# Altium footprint library Molex FFC - FPC Connectors (Through-Hole).PcbLib: 219 footprints (part 8 of 14)
Each footprint in its own frame and in the unit in brackets; x right, y up, seen from the top. Pads: shape width x height; smd on the part's side, far side on the other; paste and mask are expansions set on the pad; w line width, h text height; cw(c..) or ccw(c..) is an arc to the next point about the centre after c.
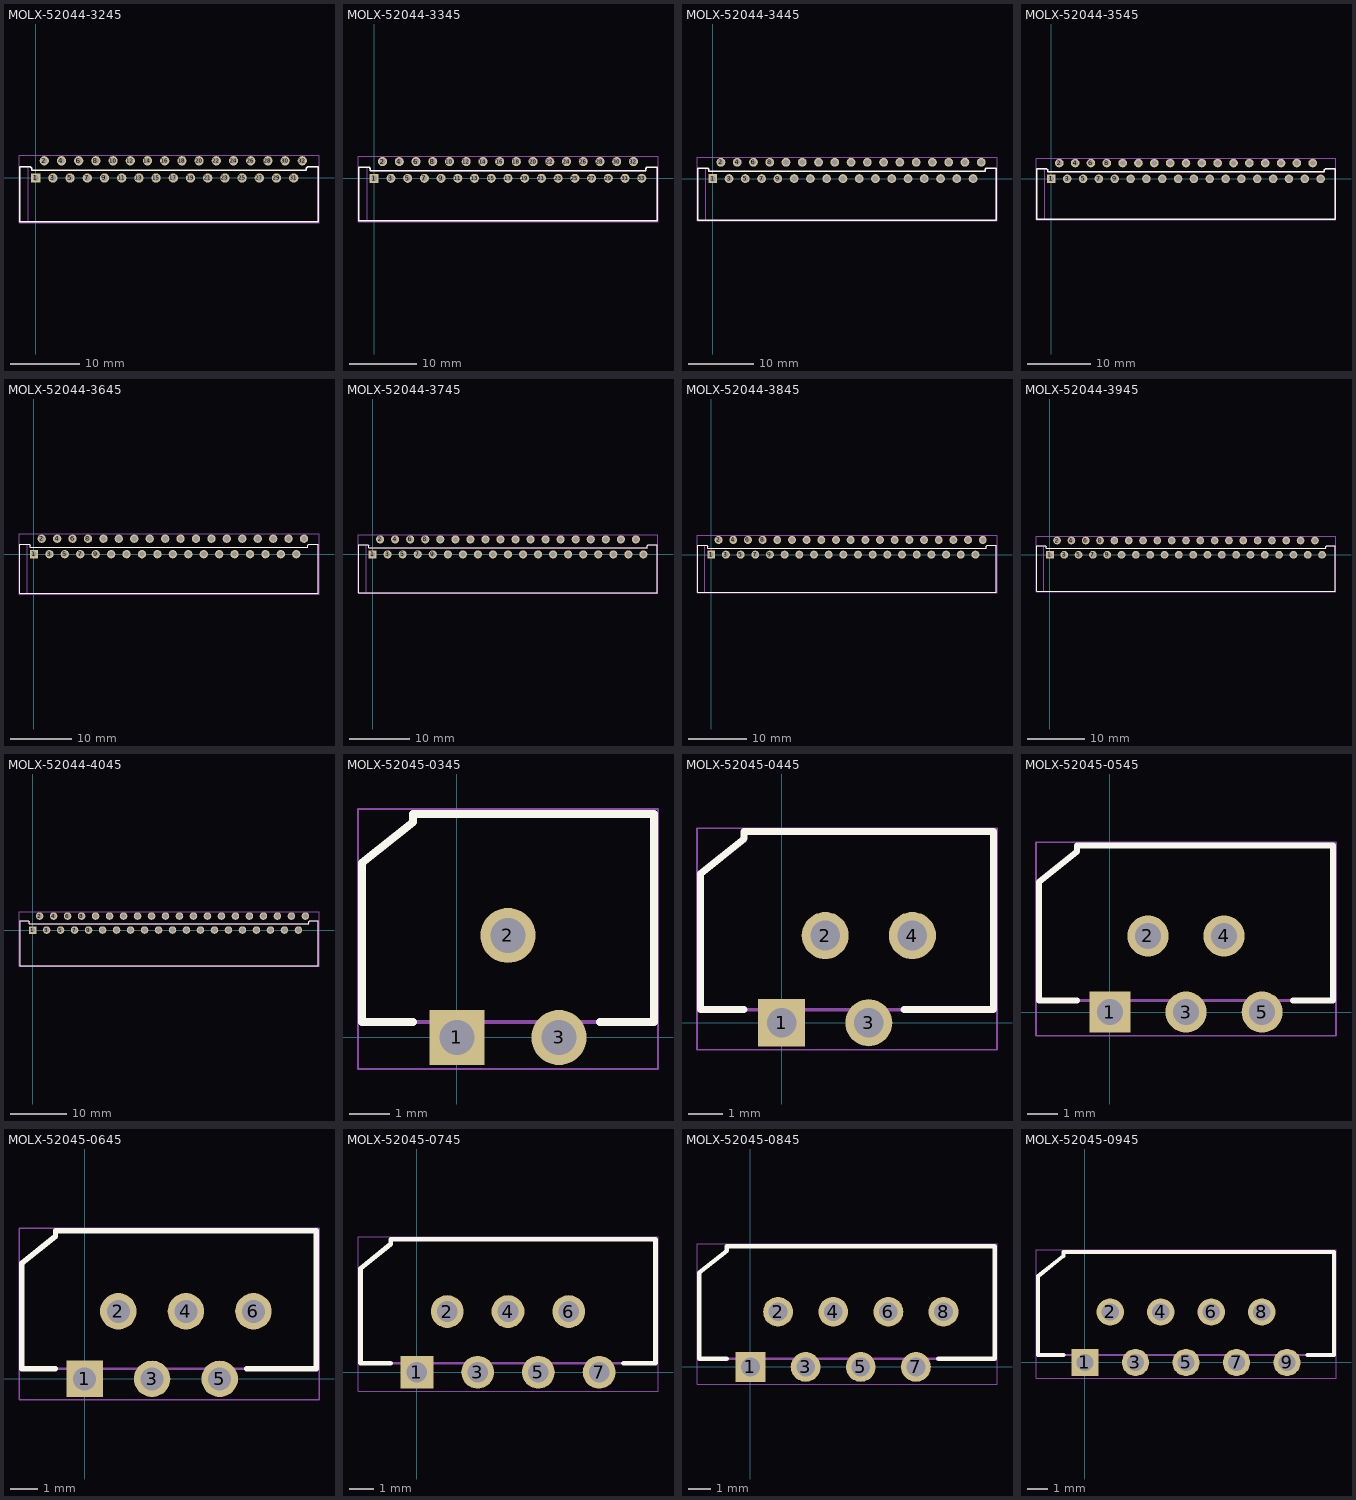
[diagram p7: the footprints below, top view; thin cyan lines are the x and y axes]

## MOLX-52044-3245 [mm] "FFC Connector, 32-Leads, Right Angle, Pitch 1.25 mm, Mated Height 5.1 mm, Through Hole"
height 5.012
pads (32):
  rect 1.35x1.35 hole 0.85: 1(0,0)
  round 1.35 hole 0.85: 2(1.25,2.5) 3(2.5,0) 4(3.75,2.5) 5(5,0) 6(6.25,2.5) 7(7.5,0) 8(8.75,2.5) 9(10,0) 10(11.25,2.5) 11(12.5,0) 12(13.75,2.5) 13(15,0) 14(16.25,2.5) 15(17.5,0) 16(18.75,2.5) 17(20,0) 18(21.25,2.5) 19(22.5,0) 20(23.75,2.5) 21(25,0) 22(26.25,2.5) 23(27.5,0) 24(28.75,2.5) 25(30,0) 26(31.25,2.5) 27(32.5,0) 28(33.75,2.5) 29(35,0) 30(36.25,2.5) 31(37.5,0) 32(38.75,2.5)
Top Overlay:
  lines w0.2: -0.775,1.625 -0.6,1.45 -0.6,1.125 39.35,1.125 39.35,1.45 39.525,1.625 41.075,1.625 41.075,-6.375 -2.325,-6.375 -2.325,1.625 -0.775,1.625 ; -0.775,1.625 -0.775,1.625
Mechanical 13:
  lines w0.1: -1.075,-6.375 -1.075,1.625 ; -2.325,-6.375 -2.325,1.625 -0.775,1.625 -0.6,1.45 -0.6,1.125 39.35,1.125 39.35,1.45 39.525,1.625 41.075,1.625 41.075,-6.375 -2.325,-6.375
Mechanical 15:
  lines w0.05: -2.425,-6.475 -2.425,3.275 41.175,3.275 41.175,-6.475 -2.425,-6.475
3D body "520443245.stp": height 5.01, standoff -3.49, extent -2.325,-6.375 41.075,2.625

## MOLX-52044-3345 [mm] "FFC Connector, 33-Leads, Right Angle, Pitch 1.25 mm, Mated Height 5.1 mm, Through Hole"
height 5.012
pads (33):
  rect 1.35x1.35 hole 0.85: 1(0,0)
  round 1.35 hole 0.85: 2(1.25,2.5) 3(2.5,0) 4(3.75,2.5) 5(5,0) 6(6.25,2.5) 7(7.5,0) 8(8.75,2.5) 9(10,0) 10(11.25,2.5) 11(12.5,0) 12(13.75,2.5) 13(15,0) 14(16.25,2.5) 15(17.5,0) 16(18.75,2.5) 17(20,0) 18(21.25,2.5) 19(22.5,0) 20(23.75,2.5) 21(25,0) 22(26.25,2.5) 23(27.5,0) 24(28.75,2.5) 25(30,0) 26(31.25,2.5) 27(32.5,0) 28(33.75,2.5) 29(35,0) 30(36.25,2.5) 31(37.5,0) 32(38.75,2.5) 33(40,0)
Top Overlay:
  lines w0.2: -2.325,1.625 -0.775,1.625 ; -2.325,1.625 -2.325,-6.375 42.325,-6.375 42.325,1.625 40.775,1.625 ; 40.6,1.125 40.6,1.45 40.775,1.625 ; 40.6,1.125 -0.6,1.125 -0.6,1.45 -0.775,1.625 ; -0.775,1.625 -0.775,1.625 ; 40.775,1.625 40.775,1.625
Mechanical 13:
  lines w0.1: -1.075,-6.375 -1.075,1.625 ; -2.325,-6.375 -2.325,1.625 -0.775,1.625 -0.6,1.45 -0.6,1.125 40.6,1.125 40.6,1.45 40.775,1.625 42.325,1.625 42.325,-6.375 -2.325,-6.375
Mechanical 15:
  lines w0.05: -2.425,-6.475 42.425,-6.475 42.425,3.275 -2.425,3.275 -2.425,-6.475
3D body "520443345.stp": height 5.01, standoff -3.49, extent -2.325,-6.375 42.325,2.625

## MOLX-52044-3445 [mm] "FFC Connector, 34-Leads, Right Angle, Pitch 1.25 mm, Mated Height 5.1 mm, Through Hole"
height 5.012
pads (34):
  rect 1.35x1.35 hole 0.85: 1(0,0)
  round 1.35 hole 0.85: 2(1.25,2.5) 3(2.5,0) 4(3.75,2.5) 5(5,0) 6(6.25,2.5) 7(7.5,0) 8(8.75,2.5) 9(10,0) 10(11.25,2.5) 11(12.5,0) 12(13.75,2.5) 13(15,0) 14(16.25,2.5) 15(17.5,0) 16(18.75,2.5) 17(20,0) 18(21.25,2.5) 19(22.5,0) 20(23.75,2.5) 21(25,0) 22(26.25,2.5) 23(27.5,0) 24(28.75,2.5) 25(30,0) 26(31.25,2.5) 27(32.5,0) 28(33.75,2.5) 29(35,0) 30(36.25,2.5) 31(37.5,0) 32(38.75,2.5) 33(40,0) 34(41.25,2.5)
Top Overlay:
  lines w0.2: -2.325,-6.375 43.575,-6.375 43.575,1.625 42.025,1.625 41.85,1.45 41.85,1.125 -0.6,1.125 -0.6,1.45 -0.775,1.625 -2.325,1.625 -2.325,-6.375
Mechanical 13:
  lines w0.1: -1.075,-6.375 -1.075,1.625 ; -2.325,-6.375 43.575,-6.375 43.575,1.625 42.025,1.625 41.85,1.45 41.85,1.125 -0.6,1.125 -0.6,1.45 -0.775,1.625 -2.325,1.625 -2.325,-6.375
Mechanical 15:
  lines w0.05: -2.425,-6.475 -2.425,3.275 43.675,3.275 43.675,-6.475 -2.425,-6.475
3D body "520443445.stp": height 5.01, standoff -3.49, extent -2.325,-6.375 43.575,2.625

## MOLX-52044-3545 [mm] "FFC Connector, 35-Leads, Right Angle, Pitch 1.25 mm, Mated Height 5.1 mm, Through Hole"
height 5.012
pads (35):
  rect 1.35x1.35 hole 0.85: 1(0,0)
  round 1.35 hole 0.85: 2(1.25,2.5) 3(2.5,0) 4(3.75,2.5) 5(5,0) 6(6.25,2.5) 7(7.5,0) 8(8.75,2.5) 9(10,0) 10(11.25,2.5) 11(12.5,0) 12(13.75,2.5) 13(15,0) 14(16.25,2.5) 15(17.5,0) 16(18.75,2.5) 17(20,0) 18(21.25,2.5) 19(22.5,0) 20(23.75,2.5) 21(25,0) 22(26.25,2.5) 23(27.5,0) 24(28.75,2.5) 25(30,0) 26(31.25,2.5) 27(32.5,0) 28(33.75,2.5) 29(35,0) 30(36.25,2.5) 31(37.5,0) 32(38.75,2.5) 33(40,0) 34(41.25,2.5) 35(42.5,0)
Top Overlay:
  lines w0.2: -2.325,-6.375 -2.325,1.625 -0.775,1.625 -0.6,1.45 -0.6,1.125 43.1,1.125 43.1,1.45 43.275,1.625 44.825,1.625 44.825,-6.375 -2.325,-6.375
Mechanical 13:
  lines w0.1: -1.075,-6.375 -1.075,1.625 ; -2.325,-6.375 -2.325,1.625 -0.775,1.625 -0.6,1.45 -0.6,1.125 43.1,1.125 43.1,1.45 43.275,1.625 44.825,1.625 44.825,-6.375 -2.325,-6.375
Mechanical 15:
  lines w0.05: -2.425,-6.475 44.925,-6.475 44.925,3.275 -2.425,3.275 -2.425,-6.475
3D body "520443545.stp": height 5.01, standoff -3.49, extent -2.325,-6.375 44.825,2.625

## MOLX-52044-3645 [mm] "FFC Connector, 36-Leads, Right Angle, Pitch 1.25 mm, Mated Height 5.1 mm, Through Hole"
height 5.012
pads (36):
  rect 1.35x1.35 hole 0.85: 1(0,0)
  round 1.35 hole 0.85: 2(1.25,2.5) 3(2.5,0) 4(3.75,2.5) 5(5,0) 6(6.25,2.5) 7(7.5,0) 8(8.75,2.5) 9(10,0) 10(11.25,2.5) 11(12.5,0) 12(13.75,2.5) 13(15,0) 14(16.25,2.5) 15(17.5,0) 16(18.75,2.5) 17(20,0) 18(21.25,2.5) 19(22.5,0) 20(23.75,2.5) 21(25,0) 22(26.25,2.5) 23(27.5,0) 24(28.75,2.5) 25(30,0) 26(31.25,2.5) 27(32.5,0) 28(33.75,2.5) 29(35,0) 30(36.25,2.5) 31(37.5,0) 32(38.75,2.5) 33(40,0) 34(41.25,2.5) 35(42.5,0) 36(43.75,2.5)
Top Overlay:
  lines w0.2: -2.325,-6.375 -2.325,1.625 -0.775,1.625 -0.6,1.45 -0.6,1.125 44.35,1.125 44.35,1.45 44.525,1.625 46.075,1.625 46.075,-6.375 -2.325,-6.375
Mechanical 13:
  lines w0.1: -1.075,-6.375 -1.075,1.625 ; -2.325,-6.375 -2.325,1.625 -0.775,1.625 -0.6,1.45 -0.6,1.125 44.35,1.125 44.35,1.45 44.525,1.625 46.075,1.625 46.075,-6.375 -2.325,-6.375
Mechanical 15:
  lines w0.05: -2.425,-6.475 46.175,-6.475 46.175,3.275 -2.425,3.275 -2.425,-6.475
3D body "520443645.stp": height 5.01, standoff -3.49, extent -2.325,-6.375 46.075,2.625

## MOLX-52044-3745 [mm] "FFC Connector, 37-Leads, Right Angle, Pitch 1.25 mm, Mated Height 5.1 mm, Through Hole"
height 5.012
pads (37):
  rect 1.35x1.35 hole 0.85: 1(0,0)
  round 1.35 hole 0.85: 2(1.25,2.5) 3(2.5,0) 4(3.75,2.5) 5(5,0) 6(6.25,2.5) 7(7.5,0) 8(8.75,2.5) 9(10,0) 10(11.25,2.5) 11(12.5,0) 12(13.75,2.5) 13(15,0) 14(16.25,2.5) 15(17.5,0) 16(18.75,2.5) 17(20,0) 18(21.25,2.5) 19(22.5,0) 20(23.75,2.5) 21(25,0) 22(26.25,2.5) 23(27.5,0) 24(28.75,2.5) 25(30,0) 26(31.25,2.5) 27(32.5,0) 28(33.75,2.5) 29(35,0) 30(36.25,2.5) 31(37.5,0) 32(38.75,2.5) 33(40,0) 34(41.25,2.5) 35(42.5,0) 36(43.75,2.5) 37(45,0)
Top Overlay:
  lines w0.2: -2.325,-6.375 -2.325,1.625 -0.775,1.625 -0.6,1.45 -0.6,1.125 45.6,1.125 45.6,1.45 45.775,1.625 47.325,1.625 47.325,-6.375 -2.325,-6.375
Mechanical 13:
  lines w0.1: -1.075,-6.375 -1.075,1.625 ; -2.325,-6.375 -2.325,1.625 -0.775,1.625 -0.6,1.45 -0.6,1.125 45.6,1.125 45.6,1.45 45.775,1.625 47.325,1.625 47.325,-6.375 -2.325,-6.375
Mechanical 15:
  lines w0.05: -2.425,-6.475 47.425,-6.475 47.425,3.275 -2.425,3.275 -2.425,-6.475
3D body "520443745.stp": height 5.01, standoff -3.49, extent -2.325,-6.375 47.325,2.625

## MOLX-52044-3845 [mm] "FFC Connector, 38-Leads, Right Angle, Pitch 1.25 mm, Mated Height 5.1 mm, Through Hole"
height 5.012
pads (38):
  rect 1.35x1.35 hole 0.85: 1(0,0)
  round 1.35 hole 0.85: 2(1.25,2.5) 3(2.5,0) 4(3.75,2.5) 5(5,0) 6(6.25,2.5) 7(7.5,0) 8(8.75,2.5) 9(10,0) 10(11.25,2.5) 11(12.5,0) 12(13.75,2.5) 13(15,0) 14(16.25,2.5) 15(17.5,0) 16(18.75,2.5) 17(20,0) 18(21.25,2.5) 19(22.5,0) 20(23.75,2.5) 21(25,0) 22(26.25,2.5) 23(27.5,0) 24(28.75,2.5) 25(30,0) 26(31.25,2.5) 27(32.5,0) 28(33.75,2.5) 29(35,0) 30(36.25,2.5) 31(37.5,0) 32(38.75,2.5) 33(40,0) 34(41.25,2.5) 35(42.5,0) 36(43.75,2.5) 37(45,0) 38(46.25,2.5)
Top Overlay:
  lines w0.2: -2.325,-6.375 -2.325,1.625 -0.775,1.625 -0.6,1.45 -0.6,1.125 46.85,1.125 46.85,1.45 47.025,1.625 48.575,1.625 48.575,-6.375 -2.325,-6.375
Mechanical 13:
  lines w0.1: -1.075,-6.375 -1.075,1.625 ; -2.325,-6.375 -2.325,1.625 -0.775,1.625 -0.6,1.45 -0.6,1.125 46.85,1.125 46.85,1.45 47.025,1.625 48.575,1.625 48.575,-6.375 -2.325,-6.375
Mechanical 15:
  lines w0.05: -2.425,-6.475 48.675,-6.475 48.675,3.275 -2.425,3.275 -2.425,-6.475
3D body "520443845.stp": height 5.01, standoff -3.49, extent -2.324,-6.374 48.576,2.626

## MOLX-52044-3945 [mm] "FFC Connector, 39-Leads, Right Angle, Pitch 1.25 mm, Mated Height 5.1 mm, Through Hole"
height 5.012
pads (39):
  rect 1.35x1.35 hole 0.85: 1(0,0)
  round 1.35 hole 0.85: 2(1.25,2.5) 3(2.5,0) 4(3.75,2.5) 5(5,0) 6(6.25,2.5) 7(7.5,0) 8(8.75,2.5) 9(10,0) 10(11.25,2.5) 11(12.5,0) 12(13.75,2.5) 13(15,0) 14(16.25,2.5) 15(17.5,0) 16(18.75,2.5) 17(20,0) 18(21.25,2.5) 19(22.5,0) 20(23.75,2.5) 21(25,0) 22(26.25,2.5) 23(27.5,0) 24(28.75,2.5) 25(30,0) 26(31.25,2.5) 27(32.5,0) 28(33.75,2.5) 29(35,0) 30(36.25,2.5) 31(37.5,0) 32(38.75,2.5) 33(40,0) 34(41.25,2.5) 35(42.5,0) 36(43.75,2.5) 37(45,0) 38(46.25,2.5) 39(47.5,0)
Top Overlay:
  lines w0.2: -0.775,1.625 -0.6,1.45 -0.6,1.125 48.1,1.125 48.1,1.45 48.275,1.625 ; -0.775,1.625 -0.775,1.625 ; -0.775,1.625 -2.325,1.625 -2.325,-6.375 49.825,-6.375 49.825,1.625 48.275,1.625 ; 48.275,1.625 48.275,1.625
Mechanical 13:
  lines w0.1: -1.075,-6.375 -1.075,1.625 ; -2.325,-6.375 -2.325,1.625 -0.775,1.625 -0.6,1.45 -0.6,1.125 48.1,1.125 48.1,1.45 48.275,1.625 49.825,1.625 49.825,-6.375 -2.325,-6.375
Mechanical 15:
  lines w0.05: -2.425,-6.475 49.925,-6.475 49.925,3.275 -2.425,3.275 -2.425,-6.475
3D body "520443945.stp": height 5.01, standoff -3.49, extent -2.325,-6.375 49.825,2.625

## MOLX-52044-4045 [mm] "FFC Connector, 40-Leads, Right Angle, Pitch 1.25 mm, Mated Height 5.1 mm, Through Hole"
height 5.012
pads (40):
  rect 1.35x1.35 hole 0.85: 1(0,0)
  round 1.35 hole 0.85: 2(1.25,2.5) 3(2.5,0) 4(3.75,2.5) 5(5,0) 6(6.25,2.5) 7(7.5,0) 8(8.75,2.5) 9(10,0) 10(11.25,2.5) 11(12.5,0) 12(13.75,2.5) 13(15,0) 14(16.25,2.5) 15(17.5,0) 16(18.75,2.5) 17(20,0) 18(21.25,2.5) 19(22.5,0) 20(23.75,2.5) 21(25,0) 22(26.25,2.5) 23(27.5,0) 24(28.75,2.5) 25(30,0) 26(31.25,2.5) 27(32.5,0) 28(33.75,2.5) 29(35,0) 30(36.25,2.5) 31(37.5,0) 32(38.75,2.5) 33(40,0) 34(41.25,2.5) 35(42.5,0) 36(43.75,2.5) 37(45,0) 38(46.25,2.5) 39(47.5,0) 40(48.75,2.5)
Top Overlay:
  lines w0.2: 51.075,1.625 49.525,1.625 ; 51.075,1.625 51.075,-6.375 -2.325,-6.375 -2.325,1.625 -0.775,1.625 ; -0.775,1.625 -0.6,1.45 -0.6,1.125 49.35,1.125 49.35,1.45 49.525,1.625 ; -0.775,1.625 -0.775,1.625 ; 49.525,1.625 49.525,1.625
Mechanical 13:
  lines w0.1: -2.325,-6.375 -2.325,1.625 -0.775,1.625 -0.6,1.45 -0.6,1.125 49.35,1.125 49.35,1.45 49.525,1.625 51.075,1.625 51.075,-6.375 -2.325,-6.375
Mechanical 15:
  lines w0.05: -2.425,-6.475 -2.425,3.275 51.175,3.275 51.175,-6.475 -2.425,-6.475
3D body "520444045.stp": height 5.01, standoff -3.49, extent -2.325,-6.375 51.075,2.625

## MOLX-52045-0345 [mm] "FFC Connector, 3-Leads, Vertical, Pitch 1.25 mm, Mated Height 8.0 mm, Through Hole"
height 8.012
pads (3):
  rect 1.35x1.35 hole 0.85: 1(0,0)
  round 1.35 hole 0.85: 2(1.25,2.5) 3(2.5,0)
Top Overlay:
  lines w0.2: -1.075,0.375 -2.325,0.375 -2.325,4.275 -1.075,5.275 -1.075,5.475 4.825,5.475 4.825,0.375 3.507,0.375
Mechanical 13:
  lines w0.1: -2.325,0.375 4.825,0.375 4.825,5.475 -1.075,5.475 -1.075,5.275 -2.325,4.275 -2.325,0.375
Mechanical 15:
  lines w0.05: -2.425,-0.775 -2.425,5.6 4.925,5.6 4.925,-0.775 -2.425,-0.775
3D body "520450345.stp": height 8.01, standoff -3.49, extent -2.325,-0.125 4.825,5.475

## MOLX-52045-0445 [mm] "FFC Connector, 4-Leads, Vertical, Pitch 1.25 mm, Mated Height 8.0 mm, Through Hole"
height 8.012
pads (4):
  rect 1.35x1.35 hole 0.85: 1(0,0)
  round 1.35 hole 0.85: 2(1.25,2.5) 3(2.5,0) 4(3.75,2.5)
Top Overlay:
  lines w0.2: -1.075,0.375 -2.325,0.375 -2.325,4.275 -1.075,5.275 -1.075,5.475 6.075,5.475 6.075,0.375 3.508,0.375
Mechanical 13:
  lines w0.1: -2.325,0.375 6.075,0.375 6.075,5.475 -1.075,5.475 -1.075,5.275 -2.325,4.275 -2.325,0.375
Mechanical 15:
  lines w0.05: -2.425,-0.775 -2.425,5.575 6.175,5.575 6.175,-0.775 -2.425,-0.775
3D body "520450445.stp": height 8.01, standoff -3.49, extent -2.325,-0.125 6.075,5.475

## MOLX-52045-0545 [mm] "FFC Connector, 5-Leads, Vertical, Pitch 1.25 mm, Mated Height 8.0 mm, Through Hole"
height 8.012
pads (5):
  rect 1.35x1.35 hole 0.85: 1(0,0)
  round 1.35 hole 0.85: 2(1.25,2.5) 3(2.5,0) 4(3.75,2.5) 5(5,0)
Top Overlay:
  lines w0.2: -1.075,0.375 -2.325,0.375 -2.325,4.275 -1.075,5.275 -1.075,5.475 7.325,5.475 7.325,0.375 6.007,0.375
Mechanical 13:
  lines w0.1: -2.325,0.375 7.325,0.375 7.325,5.475 -1.075,5.475 -1.075,5.275 -2.325,4.275 -2.325,0.375
Mechanical 15:
  lines w0.05: -2.425,-0.775 7.425,-0.775 7.425,5.575 -2.425,5.575 -2.425,-0.775
3D body "520450545.stp": height 8.01, standoff -3.49, extent -2.325,-0.125 7.325,5.475

## MOLX-52045-0645 [mm] "FFC Connector, 6-Leads, Vertical, Pitch 1.25 mm, Mated Height 8.0 mm, Through Hole"
height 8.012
pads (6):
  rect 1.35x1.35 hole 0.85: 1(0,0)
  round 1.35 hole 0.85: 2(1.25,2.5) 3(2.5,0) 4(3.75,2.5) 5(5,0) 6(6.25,2.5)
Top Overlay:
  lines w0.2: -1.075,0.375 -2.325,0.375 -2.325,4.275 -1.075,5.275 -1.075,5.475 8.575,5.475 8.575,0.375 6.008,0.375
Mechanical 13:
  lines w0.1: -2.325,0.375 8.575,0.375 8.575,5.475 -1.075,5.475 -1.075,5.275 -2.325,4.275 -2.325,0.375
Mechanical 15:
  lines w0.05: -2.425,-0.775 -2.425,5.575 8.675,5.575 8.675,-0.775 -2.425,-0.775
3D body "520450645.stp": height 8.01, standoff -3.49, extent -2.325,-0.125 8.575,5.475

## MOLX-52045-0745 [mm] "FFC Connector, 7-Leads, Vertical, Pitch 1.25 mm, Mated Height 8.0 mm, Through Hole"
height 8.012
pads (7):
  rect 1.35x1.35 hole 0.85: 1(0,0)
  round 1.35 hole 0.85: 2(1.25,2.5) 3(2.5,0) 4(3.75,2.5) 5(5,0) 6(6.25,2.5) 7(7.5,0)
Top Overlay:
  lines w0.2: -1.075,0.375 -2.325,0.375 -2.325,4.275 -1.075,5.275 -1.075,5.475 9.825,5.475 9.825,0.375 8.507,0.375
Mechanical 13:
  lines w0.1: -2.325,0.375 9.825,0.375 9.825,5.475 -1.075,5.475 -1.075,5.275 -2.325,4.275 -2.325,0.375
Mechanical 15:
  lines w0.05: -2.425,-0.775 9.925,-0.775 9.925,5.575 -2.425,5.575 -2.425,-0.775
3D body "520450745.stp": height 8.01, standoff -3.49, extent -2.325,-0.125 9.825,5.475

## MOLX-52045-0845 [mm] "FFC Connector, 8-Leads, Vertical, Pitch 1.25 mm, Mated Height 8.0 mm, Through Hole"
height 8.012
pads (8):
  rect 1.35x1.35 hole 0.85: 1(0,0)
  round 1.35 hole 0.85: 2(1.25,2.5) 3(2.5,0) 4(3.75,2.5) 5(5,0) 6(6.25,2.5) 7(7.5,0) 8(8.75,2.5)
Top Overlay:
  lines w0.2: -1.075,0.375 -2.325,0.375 -2.325,4.275 -1.075,5.275 -1.075,5.475 11.075,5.475 11.075,0.375 8.507,0.375
Mechanical 13:
  lines w0.1: -2.325,0.375 11.075,0.375 11.075,5.475 -1.075,5.475 -1.075,5.275 -2.325,4.275 -2.325,0.375
Mechanical 15:
  lines w0.05: -2.425,-0.775 -2.425,5.575 11.175,5.575 11.175,-0.775 -2.425,-0.775
3D body "520450845.stp": height 8.01, standoff -3.49, extent -2.325,-0.125 11.075,5.475

## MOLX-52045-0945 [mm] "FFC Connector, 9-Leads, Vertical, Pitch 1.25 mm, Mated Height 8.0 mm, Through Hole"
height 8.012
pads (9):
  rect 1.35x1.35 hole 0.85: 1(0,0)
  round 1.35 hole 0.85: 2(1.25,2.5) 3(2.5,0) 4(3.75,2.5) 5(5,0) 6(6.25,2.5) 7(7.5,0) 8(8.75,2.5) 9(10,0)
Top Overlay:
  lines w0.2: -1.075,0.375 -2.325,0.375 -2.325,4.275 -1.075,5.275 -1.075,5.475 12.325,5.475 12.325,0.375 11.007,0.375
Mechanical 13:
  lines w0.1: -2.325,0.375 -2.325,4.275 -1.075,5.275 -1.075,5.475 12.325,5.475 12.325,0.375 -2.325,0.375
Mechanical 15:
  lines w0.05: -2.425,-0.775 -2.425,5.575 12.425,5.575 12.425,-0.775 -2.425,-0.775
3D body "520450945.stp": height 8.01, standoff -3.49, extent -2.325,-0.125 12.325,5.475